# Altium footprint library ICs And Semiconductors THD.PcbLib: 507 footprints (part 24 of 32)
Each footprint in its own frame and in the unit in brackets; x right, y up, seen from the top. Pads: shape width x height; smd on the part's side, far side on the other; paste and mask are expansions set on the pad; w line width, h text height; cw(c..) or ccw(c..) is an arc to the next point about the centre after c.
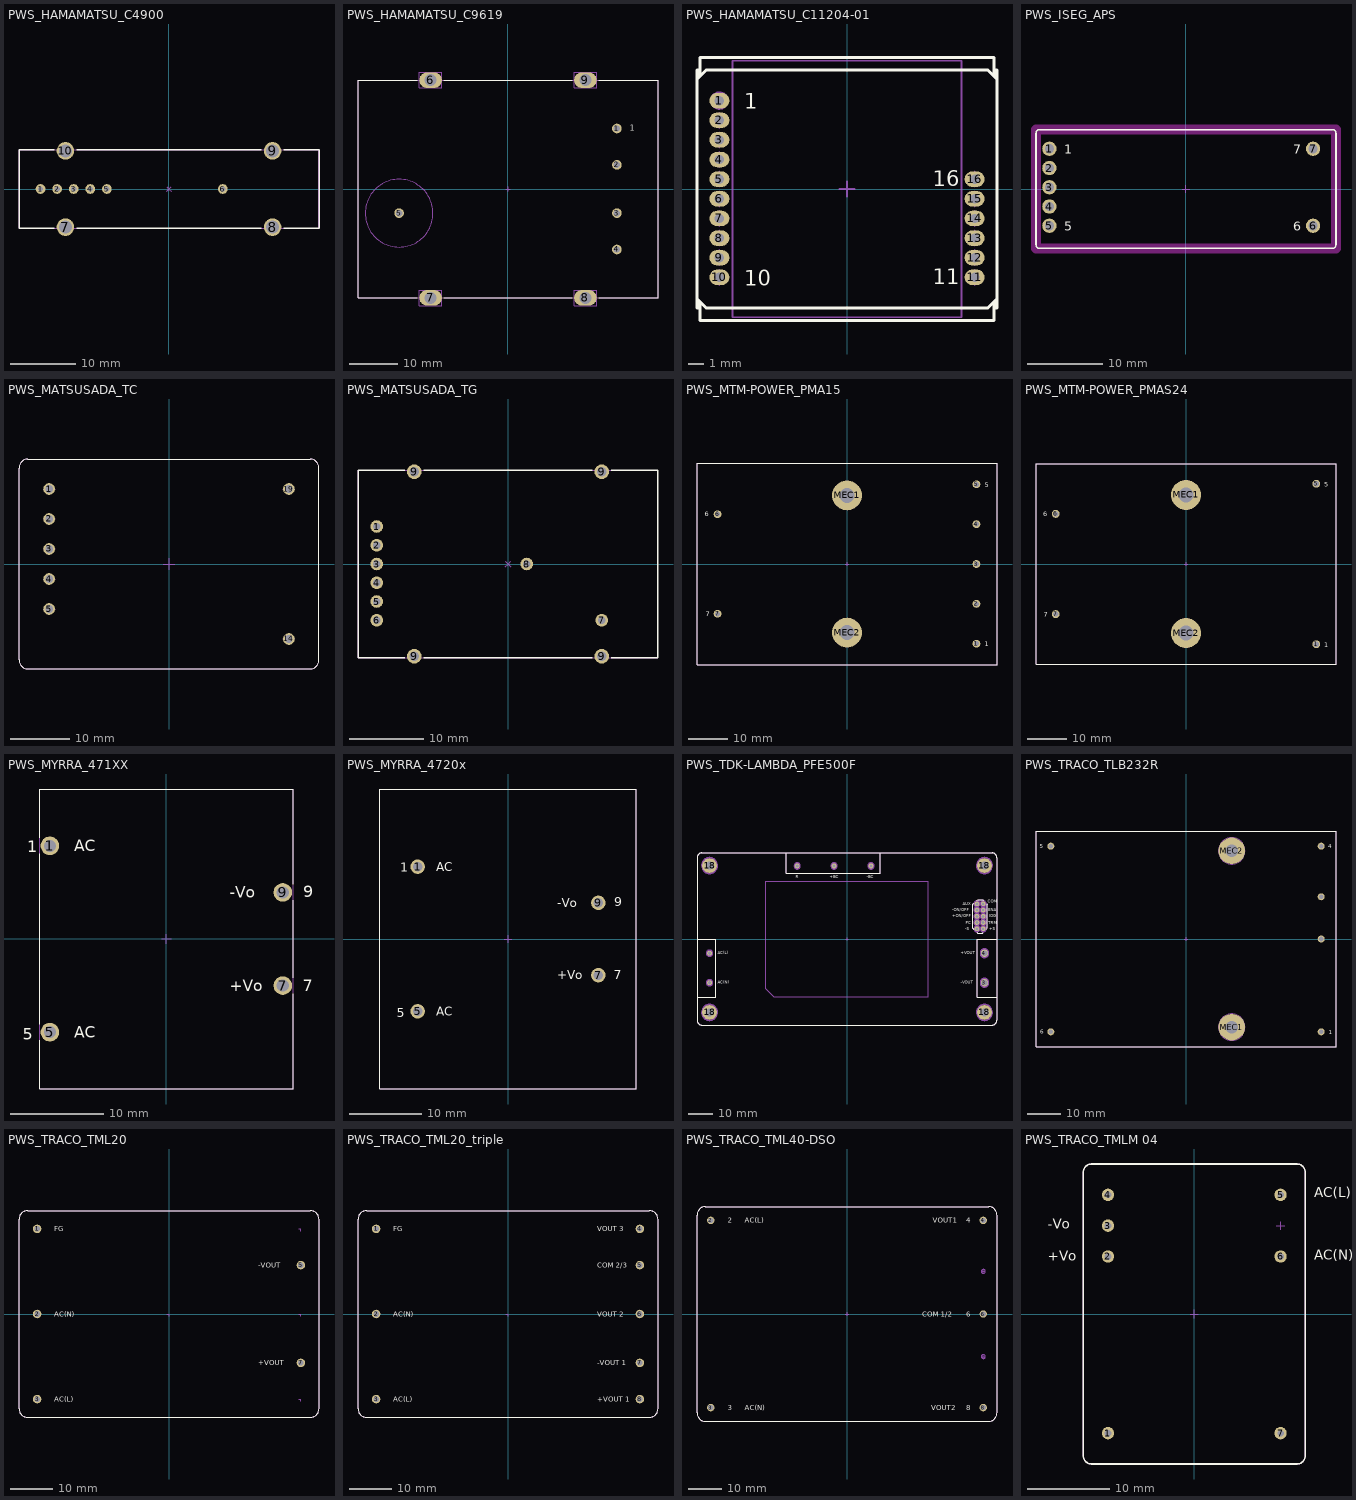
[diagram p23: the footprints below, top view; thin cyan lines are the x and y axes]

## PWS_HAMAMATSU_C4900 [mm] "HAMAMATSU C4900 Series, High Voltage Power Supply , Body 46x12mm"
height 24.5
pads (10):
  round 1.5 hole 0.8: 1(-19.69,0) 2(-17.15,0) 3(-14.61,0) 4(-12.07,0) 5(-9.53,0) 6(8.25,0)
  round 2.7 hole 2: 7(-15.88,-5.85) 8(15.88,-5.85) 9(15.88,5.85) 10(-15.88,5.85)
Top Overlay:
  lines w0.2: -17.623,-6 -23,-6 -23,6 -17.623,6 ; -14.136,-6 14.137,-6 ; -14.136,6 14.137,6 ; 17.624,-6 23,-6 23,6 17.624,6
Notvisible:
  lines w0.1: -20.19,0 -19.69,0 ; -19.69,-0.5 -19.69,0 ; -19.69,0.5 -19.69,0 ; -19.19,0 -19.69,0 ; -17.65,0 -17.15,0 ; -17.15,-0.5 -17.15,0 ; -17.15,0.5 -17.15,0 ; -16.65,0 -17.15,0 ; -16.38,-5.85 -15.88,-5.85 ; -16.38,5.85 -15.88,5.85 ; -15.88,-6.35 -15.88,-5.85 ; -15.88,-5.35 -15.88,-5.85 ; -15.88,5.35 -15.88,5.85 ; -15.88,6.35 -15.88,5.85 ; -15.38,-5.85 -15.88,-5.85 ; -15.38,5.85 -15.88,5.85 ; -15.11,0 -14.61,0 ; -14.61,-0.5 -14.61,0 ; -14.61,0.5 -14.61,0 ; -14.11,0 -14.61,0 ; -12.57,0 -12.07,0 ; -12.07,-0.5 -12.07,0 ; -12.07,0.5 -12.07,0 ; -11.57,0 -12.07,0 ; -10.03,0 -9.53,0 ; -9.53,-0.5 -9.53,0 ; -9.53,0.5 -9.53,0 ; -9.03,0 -9.53,0 ; -0.354,-0.354 0,0 ; -0.354,0.354 0,0 ; 0.354,-0.354 0,0 ; 0.354,0.354 0,0 ; 7.75,0 8.25,0 ; 8.25,-0.5 8.25,0 ; 8.25,0.5 8.25,0 ; 8.75,0 8.25,0 ; 15.38,-5.85 15.88,-5.85 ; 15.38,5.85 15.88,5.85 ; 15.88,-6.35 15.88,-5.85 ; 15.88,-5.35 15.88,-5.85 ; 15.88,5.35 15.88,5.85 ; 15.88,6.35 15.88,5.85 ; 16.38,-5.85 15.88,-5.85 ; 16.38,5.85 15.88,5.85
Mechanical 14:
  lines w0.1: -23,-6 23,-6 23,6 -23,6 -23,-6
3D body "PWS_HAMAMATSU_C4900.stp": height 24.5, standoff -3.6, extent -23,-6 23,6

## PWS_HAMAMATSU_C9619 [mm] "HAMAMATSU C9619 Series, High Voltage Power Supply , Body 62x45mm"
height 16
pads (9):
  round 2 hole 1.3: 1(22.5,12.5) 2(22.5,5) 3(22.5,-5) 4(22.5,-12.5) 5(-22.5,-5)
  rrect100% 4.7x3.2 hole 2.5: 6(-16,22.5) 7(-16,-22.5) 8(16,-22.5) 9(16,22.5)
Top Overlay:
  lines w0.2: -18.75,-22.5 -31,-22.5 -31,22.5 -18.75,22.5 ; -13.25,-22.5 13.25,-22.5 ; -13.25,22.5 13.25,22.5 ; 18.75,-22.5 31,-22.5 31,22.5 18.75,22.5
  text "1" at 25.2,12.05 h1.2
Notvisible:
  circle w0.254: c-22.5,-5 r7
  circle w0.1: c-16,22.5 r1.25
  circle w0.1: c-16,-22.5 r1.25
  circle w0.1: c16,-22.5 r1.25
  circle w0.1: c16,22.5 r1.25
  lines w0.1: -23,-5 -22.5,-5 ; -22.5,-5.5 -22.5,-5 ; -22.5,-4.5 -22.5,-5 ; -22,-5 -22.5,-5 ; -16.5,-22.5 -16,-22.5 ; -16.5,22.5 -16,22.5 ; -16,-23 -16,-22.5 ; -16,-22 -16,-22.5 ; -16,22 -16,22.5 ; -16,23 -16,22.5 ; -15.5,-22.5 -16,-22.5 ; -15.5,22.5 -16,22.5 ; -0.5,0 0,0 ; 0,-0.5 0,0 ; 0,0.5 0,0 ; 0.5,0 0,0 ; 15.5,-22.5 16,-22.5 ; 15.5,22.5 16,22.5 ; 16,-23 16,-22.5 ; 16,-22 16,-22.5 ; 16,22 16,22.5 ; 16,23 16,22.5 ; 16.5,-22.5 16,-22.5 ; 16.5,22.5 16,22.5 ; 22,-12.5 22.5,-12.5 ; 22,-5 22.5,-5 ; 22,5 22.5,5 ; 22,12.5 22.5,12.5 ; 22.5,-13 22.5,-12.5 ; 22.5,-12 22.5,-12.5 ; 22.5,-5.5 22.5,-5 ; 22.5,-4.5 22.5,-5 ; 22.5,4.5 22.5,5 ; 22.5,5.5 22.5,5 ; 22.5,12 22.5,12.5 ; 22.5,13 22.5,12.5 ; 23,-12.5 22.5,-12.5 ; 23,-5 22.5,-5 ; 23,5 22.5,5 ; 23,12.5 22.5,12.5 ; -18.35,-24.1 -13.65,-24.1 -13.65,-20.9 -18.35,-20.9 -18.35,-24.1 ; -18.35,20.9 -13.65,20.9 -13.65,24.1 -18.35,24.1 -18.35,20.9 ; 13.65,-24.1 18.35,-24.1 18.35,-20.9 13.65,-20.9 13.65,-24.1 ; 13.65,20.9 18.35,20.9 18.35,24.1 13.65,24.1 13.65,20.9
Mechanical 14:
  lines w0.1: -31,-22.5 31,-22.5 31,22.5 -31,22.5 -31,-22.5
  text "1" at 25.2,12.05 h1.2
3D body "PWS_HAMAMATSU_C9619.stp": height 16, standoff -3, extent -31,-22.5 31,22.5

## PWS_HAMAMATSU_C11204-01 [mm] "50V to 90V Bias Power Supply with Built-in High Precision Temperature Compensation for MPPCs, Body 19.4x17mm"
height 6.3
pads (16):
  oval 1.3x1 hole 0.6: 1(-8.255,5.715) 2(-8.255,4.445) 3(-8.255,3.175) 4(-8.255,1.905) 5(-8.255,0.635) 6(-8.255,-0.635) 7(-8.255,-1.905) 8(-8.255,-3.175) 9(-8.255,-4.445) 10(-8.255,-5.715) 11(8.255,-5.715) 12(8.255,-4.445) 13(8.255,-3.175) 14(8.255,-1.905) 15(8.255,-0.635) 16(8.255,0.635)
Top Overlay:
  lines w0.2: -9.7,-7.1 -9.1,-7.7 9.1,-7.7 9.7,-7.1 ; -9.7,7.1 -9.1,7.7 9.1,7.7 9.7,7.1 ; -9.5,-7.3 -9.5,-8.5 9.5,-8.5 9.5,-7.3 ; -9.5,7.3 -9.5,8.5 9.5,8.5 9.5,7.3 ; -9.5,7.7 -9.7,7.7 -9.7,-7.7 ; 9.5,-7.7 9.7,-7.7 9.7,7.7 9.5,7.7 ; -9.7,-7.7 -9.5,-7.7 -9.7,-7.7
  text "1" at -6.65,5.175 h1
  text "10" at -6.65,-6.255 h1
  text "11" at 5.53,-6.165 h1
  text "16" at 5.53,0.185 h1
Notvisible:
  circle w0.1: c-8.255,5.715 r0.55
  circle w0.1: c-8.255,5.715 r0.3
  lines w0.1: -8.755,-5.715 -8.255,-5.715 ; -8.755,-4.445 -8.255,-4.445 ; -8.755,-3.175 -8.255,-3.175 ; -8.755,-1.905 -8.255,-1.905 ; -8.755,-0.635 -8.255,-0.635 ; -8.755,0.635 -8.255,0.635 ; -8.755,1.905 -8.255,1.905 ; -8.755,3.175 -8.255,3.175 ; -8.755,4.445 -8.255,4.445 ; -8.755,5.715 -8.255,5.715 ; -8.255,-6.215 -8.255,-5.715 ; -8.255,-5.215 -8.255,-5.715 ; -8.255,-4.945 -8.255,-4.445 ; -8.255,-3.945 -8.255,-4.445 ; -8.255,-3.675 -8.255,-3.175 ; -8.255,-2.675 -8.255,-3.175 ; -8.255,-2.405 -8.255,-1.905 ; -8.255,-1.405 -8.255,-1.905 ; -8.255,-1.135 -8.255,-0.635 ; -8.255,-0.135 -8.255,-0.635 ; -8.255,0.135 -8.255,0.635 ; -8.255,1.135 -8.255,0.635 ; -8.255,1.405 -8.255,1.905 ; -8.255,2.405 -8.255,1.905 ; -8.255,2.675 -8.255,3.175 ; -8.255,3.675 -8.255,3.175 ; -8.255,3.945 -8.255,4.445 ; -8.255,4.945 -8.255,4.445 ; -8.255,5.215 -8.255,5.715 ; -8.255,6.215 -8.255,5.715 ; -7.755,-5.715 -8.255,-5.715 ; -7.755,-4.445 -8.255,-4.445 ; -7.755,-3.175 -8.255,-3.175 ; -7.755,-1.905 -8.255,-1.905 ; -7.755,-0.635 -8.255,-0.635 ; -7.755,0.635 -8.255,0.635 ; -7.755,1.905 -8.255,1.905 ; -7.755,3.175 -8.255,3.175 ; -7.755,4.445 -8.255,4.445 ; -7.755,5.715 -8.255,5.715 ; -0.5,0 0,0 ; 0,-0.5 0,0 ; 0,0.5 0,0 ; 0.5,0 0,0 ; 7.755,-5.715 8.255,-5.715 ; 7.755,-4.445 8.255,-4.445 ; 7.755,-3.175 8.255,-3.175 ; 7.755,-1.905 8.255,-1.905 ; 7.755,-0.635 8.255,-0.635 ; 7.755,0.635 8.255,0.635 ; 8.255,-6.215 8.255,-5.715 ; 8.255,-5.215 8.255,-5.715 ; 8.255,-4.945 8.255,-4.445 ; 8.255,-3.945 8.255,-4.445 ; 8.255,-3.675 8.255,-3.175 ; 8.255,-2.675 8.255,-3.175 ; 8.255,-2.405 8.255,-1.905 ; 8.255,-1.405 8.255,-1.905 ; 8.255,-1.135 8.255,-0.635 ; 8.255,-0.135 8.255,-0.635 ; 8.255,0.135 8.255,0.635 ; 8.255,1.135 8.255,0.635 ; 8.755,-5.715 8.255,-5.715 ; 8.755,-4.445 8.255,-4.445 ; 8.755,-3.175 8.255,-3.175 ; 8.755,-1.905 8.255,-1.905 ; 8.755,-0.635 8.255,-0.635 ; 8.755,0.635 8.255,0.635 ; -7.405,-8.3 7.405,-8.3 7.405,8.3 -7.405,8.3 -7.405,-8.3
Mechanical 14:
  lines w0.1: -9.7,-7.1 -9.1,-7.7 9.1,-7.7 9.7,-7.1 ; -9.7,7.1 -9.1,7.7 9.1,7.7 9.7,7.1 ; -9.5,-7.3 -9.5,-8.5 9.5,-8.5 9.5,-7.3 ; -9.5,7.3 -9.5,8.5 9.5,8.5 9.5,7.3 ; -9.5,7.7 -9.7,7.7 -9.7,-7.7 ; 9.5,-7.7 9.7,-7.7 9.7,7.7 9.5,7.7 ; -9.7,-7.7 -9.5,-7.7 -9.7,-7.7
  text "1" at -6.65,5.175 h1
  text "10" at -6.65,-6.255 h1
  text "11" at 5.53,-6.165 h1
  text "16" at 5.53,0.185 h1
3D body "PWS_HAMAMATSU_C11204-01.stp": height 5.3, standoff -2.6, extent -9.7,-8.5 9.7,8.5

## PWS_ISEG_APS [mm] "Body 39.6x15.7mm, 1W High Voltage Power Supply APS-series"
height 11
pads (7):
  round 1.9 hole 1.2: 1(-18.03,5.31) 2(-18.03,2.77) 3(-18.03,0.23) 4(-18.03,-2.31) 5(-18.03,-4.85) 6(16.77,-4.85) 7(16.77,5.31)
Top Layer keep-out:
  lines w1.27: -19.8,-7.85 -19.8,7.85 19.8,7.85 19.8,-7.85 -19.8,-7.85
Top Overlay:
  lines w0.2: -19.8,-7.35 ccw(c-19.3,-7.35) -19.3,-7.85 19.3,-7.85 ccw(c19.3,-7.35) 19.8,-7.35 19.8,7.35 ccw(c19.3,7.35) 19.3,7.85 -19.3,7.85 ccw(c-19.3,7.35) -19.8,7.35 -19.8,-7.35
  text "6" at 14.16,-5.49 h1.2
  text "7" at 14.16,4.67 h1.2
  text "1" at -16.07,4.655 h1.2
  text "5" at -16.07,-5.505 h1.2
Notvisible:
  lines w0.1: -18.53,-4.85 -18.03,-4.85 ; -18.53,-2.31 -18.03,-2.31 ; -18.53,0.23 -18.03,0.23 ; -18.53,2.77 -18.03,2.77 ; -18.53,5.31 -18.03,5.31 ; -18.03,-5.35 -18.03,-4.85 ; -18.03,-4.35 -18.03,-4.85 ; -18.03,-2.81 -18.03,-2.31 ; -18.03,-1.81 -18.03,-2.31 ; -18.03,-0.27 -18.03,0.23 ; -18.03,0.73 -18.03,0.23 ; -18.03,2.27 -18.03,2.77 ; -18.03,3.27 -18.03,2.77 ; -18.03,4.81 -18.03,5.31 ; -18.03,5.81 -18.03,5.31 ; -17.53,-4.85 -18.03,-4.85 ; -17.53,-2.31 -18.03,-2.31 ; -17.53,0.23 -18.03,0.23 ; -17.53,2.77 -18.03,2.77 ; -17.53,5.31 -18.03,5.31 ; -0.5,0 0,0 ; 0,-0.5 0,0 ; 0,0.5 0,0 ; 0.5,0 0,0 ; 16.27,-4.85 16.77,-4.85 ; 16.27,5.31 16.77,5.31 ; 16.77,-5.35 16.77,-4.85 ; 16.77,-4.35 16.77,-4.85 ; 16.77,4.81 16.77,5.31 ; 16.77,5.81 16.77,5.31 ; 17.27,-4.85 16.77,-4.85 ; 17.27,5.31 16.77,5.31
Mechanical 14:
  lines w0.1: -19.8,-7.35 ccw(c-19.3,-7.35) -19.3,-7.85 19.3,-7.85 ccw(c19.3,-7.35) 19.8,-7.35 19.8,7.35 ccw(c19.3,7.35) 19.3,7.85 -19.3,7.85 ccw(c-19.3,7.35) -19.8,7.35 -19.8,-7.35
  text "6" at 14.16,-5.49 h1.2
  text "7" at 14.16,4.67 h1.2
  text "1" at -16.07,4.655 h1.2
  text "5" at -16.07,-5.505 h1.2
3D body "PWS_ISEG_APS.stp": height 11, standoff -2.2, extent -19.8,-7.85 19.8,7.85

## PWS_MATSUSADA_TC [mm] "TC Serie, Body 50.8x35.5mm, High Voltage Power Supply"
height 16.2
pads (7):
  round 2 hole 1.3: 1(-20.3,12.7) 2(-20.3,7.62) 3(-20.3,2.54) 4(-20.3,-2.54) 5(-20.3,-7.62) 14(20.3,-12.7) 19(20.3,12.7)
Top Overlay:
  lines w0.2: -25.4,-16.25 ccw(c-23.9,-16.25) -23.9,-17.75 23.9,-17.75 ccw(c23.9,-16.25) 25.4,-16.25 25.4,16.25 ccw(c23.9,16.25) 23.9,17.75 -23.9,17.75 ccw(c-23.9,16.25) -25.4,16.25 -25.4,-16.25
Notvisible:
  lines w0.1: -21.3,-7.62 -20.3,-7.62 ; -21.3,-2.54 -20.3,-2.54 ; -21.3,2.54 -20.3,2.54 ; -21.3,7.62 -20.3,7.62 ; -21.3,12.7 -20.3,12.7 ; -20.3,-8.62 -20.3,-7.62 ; -20.3,-6.62 -20.3,-7.62 ; -20.3,-3.54 -20.3,-2.54 ; -20.3,-1.54 -20.3,-2.54 ; -20.3,1.54 -20.3,2.54 ; -20.3,3.54 -20.3,2.54 ; -20.3,6.62 -20.3,7.62 ; -20.3,8.62 -20.3,7.62 ; -20.3,11.7 -20.3,12.7 ; -20.3,13.7 -20.3,12.7 ; -19.3,-7.62 -20.3,-7.62 ; -19.3,-2.54 -20.3,-2.54 ; -19.3,2.54 -20.3,2.54 ; -19.3,7.62 -20.3,7.62 ; -19.3,12.7 -20.3,12.7 ; -1,0 0,0 ; 0,-1 0,0 ; 0,1 0,0 ; 1,0 0,0 ; 19.3,-12.7 20.3,-12.7 ; 19.3,12.7 20.3,12.7 ; 20.3,-13.7 20.3,-12.7 ; 20.3,-11.7 20.3,-12.7 ; 20.3,11.7 20.3,12.7 ; 20.3,13.7 20.3,12.7 ; 21.3,-12.7 20.3,-12.7 ; 21.3,12.7 20.3,12.7
Mechanical 14:
  lines w0.1: -25.4,-16.25 ccw(c-23.9,-16.25) -23.9,-17.75 23.9,-17.75 ccw(c23.9,-16.25) 25.4,-16.25 25.4,16.25 ccw(c23.9,16.25) 23.9,17.75 -23.9,17.75 ccw(c-23.9,16.25) -25.4,16.25 -25.4,-16.25
3D body "PWS_MATSUSADA_TC.stp": height 16.2, standoff -3.6, extent -25.4,-17.75 25.4,17.75

## PWS_MATSUSADA_TG [mm] "TG Serie, Body 40.64x25.4mm, PMT High Voltage Power Supply"
height 12.3
pads (12):
  round 1.7 hole 1: 1(-17.78,5.08) 2(-17.78,2.54) 3(-17.78,0) 4(-17.78,-2.54) 5(-17.78,-5.08) 6(-17.78,-7.62) 7(12.7,-7.62) 8(2.54,0)
  round 2 hole 1.3: 9(-12.7,-12.5) 9(-12.7,12.5) 9(12.7,-12.5) 9(12.7,12.5)
Top Overlay:
  lines w0.2: -13.985,-12.7 -20.32,-12.7 -20.32,12.7 -13.985,12.7 ; -11.415,-12.7 11.415,-12.7 ; -11.415,12.7 11.415,12.7 ; 13.985,-12.7 20.32,-12.7 20.32,12.7 13.985,12.7
Notvisible:
  lines w0.1: -18.28,-7.62 -17.78,-7.62 ; -18.28,-5.08 -17.78,-5.08 ; -18.28,-2.54 -17.78,-2.54 ; -18.28,0 -17.78,0 ; -18.28,2.54 -17.78,2.54 ; -18.28,5.08 -17.78,5.08 ; -17.78,-8.12 -17.78,-7.62 ; -17.78,-7.12 -17.78,-7.62 ; -17.78,-5.58 -17.78,-5.08 ; -17.78,-4.58 -17.78,-5.08 ; -17.78,-3.04 -17.78,-2.54 ; -17.78,-2.04 -17.78,-2.54 ; -17.78,-0.5 -17.78,0 ; -17.78,0.5 -17.78,0 ; -17.78,2.04 -17.78,2.54 ; -17.78,3.04 -17.78,2.54 ; -17.78,4.58 -17.78,5.08 ; -17.78,5.58 -17.78,5.08 ; -17.28,-7.62 -17.78,-7.62 ; -17.28,-5.08 -17.78,-5.08 ; -17.28,-2.54 -17.78,-2.54 ; -17.28,0 -17.78,0 ; -17.28,2.54 -17.78,2.54 ; -17.28,5.08 -17.78,5.08 ; -13.2,-12.5 -12.7,-12.5 ; -13.2,12.5 -12.7,12.5 ; -12.7,-13 -12.7,-12.5 ; -12.7,-12 -12.7,-12.5 ; -12.7,12 -12.7,12.5 ; -12.7,13 -12.7,12.5 ; -12.2,-12.5 -12.7,-12.5 ; -12.2,12.5 -12.7,12.5 ; -0.354,-0.354 0,0 ; -0.354,0.354 0,0 ; 0.354,-0.354 0,0 ; 0.354,0.354 0,0 ; 2.04,0 2.54,0 ; 2.54,-0.5 2.54,0 ; 2.54,0.5 2.54,0 ; 3.04,0 2.54,0 ; 12.2,-12.5 12.7,-12.5 ; 12.2,-7.62 12.7,-7.62 ; 12.2,12.5 12.7,12.5 ; 12.7,-13 12.7,-12.5 ; 12.7,-12 12.7,-12.5 ; 12.7,-8.12 12.7,-7.62 ; 12.7,-7.12 12.7,-7.62 ; 12.7,12 12.7,12.5 ; 12.7,13 12.7,12.5 ; 13.2,-12.5 12.7,-12.5 ; 13.2,-7.62 12.7,-7.62 ; 13.2,12.5 12.7,12.5
Mechanical 14:
  lines w0.1: -20.32,-12.7 20.32,-12.7 20.32,12.7 -20.32,12.7 -20.32,-12.7
3D body "PWS_MATSUSADA_TG.stp": height 12.3, standoff -3, extent -20.32,-12.7 20.32,12.7

## PWS_MTM-POWER_PMA15 [mm] "15W AC/DC Power Module, Body 76x50.8mm, PMA 15 Series"
height 23
pads (9):
  round 2 hole 1.3: 1(33,-20.32) 2(33,-10.16) 3(33,0) 4(33,10.16) 5(33,20.32) 6(-33,12.7) 7(-33,-12.7)
  round 7.6 hole 3.8: MEC1(0,17.5) MEC2(0,-17.5)
Top Overlay:
  lines w0.2: -38.25,-25.65 -38.25,25.65 38.25,25.65 38.25,-25.65 -38.25,-25.65
  text "1" at 35.08,-21.03 h1.2
  text "5" at 35.08,19.61 h1.2
  text "6" at -36.22,12.16 h1.2
  text "7" at -36.02,-13.305 h1.2
Notvisible:
  circle w0.1: c0,-17.5 r3.5
  circle w0.1: c0,17.5 r3.5
  lines w0.1: -33.5,-12.7 -33,-12.7 ; -33.5,12.7 -33,12.7 ; -33,-13.2 -33,-12.7 ; -33,-12.2 -33,-12.7 ; -33,12.2 -33,12.7 ; -33,13.2 -33,12.7 ; -32.5,-12.7 -33,-12.7 ; -32.5,12.7 -33,12.7 ; -0.5,-17.5 0,-17.5 ; -0.5,0 0,0 ; -0.5,17.5 0,17.5 ; 0,-18 0,-17.5 ; 0,-17 0,-17.5 ; 0,-0.5 0,0 ; 0,0.5 0,0 ; 0,17 0,17.5 ; 0,18 0,17.5 ; 0.5,-17.5 0,-17.5 ; 0.5,0 0,0 ; 0.5,17.5 0,17.5 ; 32.5,-20.32 33,-20.32 ; 32.5,-10.16 33,-10.16 ; 32.5,0 33,0 ; 32.5,10.16 33,10.16 ; 32.5,20.32 33,20.32 ; 33,-20.82 33,-20.32 ; 33,-19.82 33,-20.32 ; 33,-10.66 33,-10.16 ; 33,-9.66 33,-10.16 ; 33,-0.5 33,0 ; 33,0.5 33,0 ; 33,9.66 33,10.16 ; 33,10.66 33,10.16 ; 33,19.82 33,20.32 ; 33,20.82 33,20.32 ; 33.5,-20.32 33,-20.32 ; 33.5,-10.16 33,-10.16 ; 33.5,0 33,0 ; 33.5,10.16 33,10.16 ; 33.5,20.32 33,20.32
Mechanical 14:
  lines w0.1: -38.25,-25.65 -38.25,25.65 38.25,25.65 38.25,-25.65 -38.25,-25.65
  text "1" at 35.08,-21.03 h1.2
  text "5" at 35.08,19.61 h1.2
  text "6" at -36.22,12.16 h1.2
  text "7" at -36.02,-13.305 h1.2
3D body "MTM-POWER_PMA15.stp": height 23, standoff -3.6, extent -38.25,-25.65 38.25,25.65

## PWS_MTM-POWER_PMAS24 [mm] "24W AC/DC Power Module, Body 76x50.7mm, PMAS24 Series"
height 22.7
pads (6):
  round 2 hole 1.3: 1(33,-20.32) 5(33,20.32) 6(-33,12.7) 7(-33,-12.7)
  round 7.6 hole 3.8: MEC1(0,17.5) MEC2(0,-17.5)
Top Overlay:
  lines w0.2: -38,-25.35 38,-25.35 38,25.35 -38,25.35 -38,-25.35
  text "1" at 35.08,-21.03 h1.2
  text "5" at 35.08,19.61 h1.2
  text "6" at -36.22,12.16 h1.2
  text "7" at -36.02,-13.305 h1.2
Notvisible:
  circle w0.1: c0,-17.5 r3.5
  circle w0.1: c0,17.5 r3.5
  lines w0.1: -33.5,-12.7 -33,-12.7 ; -33.5,12.7 -33,12.7 ; -33,-13.2 -33,-12.7 ; -33,-12.2 -33,-12.7 ; -33,12.2 -33,12.7 ; -33,13.2 -33,12.7 ; -32.5,-12.7 -33,-12.7 ; -32.5,12.7 -33,12.7 ; -0.5,-17.5 0,-17.5 ; -0.5,0 0,0 ; -0.5,17.5 0,17.5 ; 0,-18 0,-17.5 ; 0,-17 0,-17.5 ; 0,-0.5 0,0 ; 0,0.5 0,0 ; 0,17 0,17.5 ; 0,18 0,17.5 ; 0.5,-17.5 0,-17.5 ; 0.5,0 0,0 ; 0.5,17.5 0,17.5 ; 32.5,-20.32 33,-20.32 ; 32.5,20.32 33,20.32 ; 33,-20.82 33,-20.32 ; 33,-19.82 33,-20.32 ; 33,19.82 33,20.32 ; 33,20.82 33,20.32 ; 33.5,-20.32 33,-20.32 ; 33.5,20.32 33,20.32
Mechanical 14:
  lines w0.1: -38,-25.35 38,-25.35 38,25.35 -38,25.35 -38,-25.35
  text "1" at 35.08,-21.03 h1.2
  text "5" at 35.08,19.61 h1.2
  text "6" at -36.22,12.16 h1.2
  text "7" at -36.02,-13.305 h1.2
3D body "MTM-POWER_PMAS.stp": height 22.7, standoff -3.6, extent -38,-25.35 38,25.35

## PWS_MYRRA_471XX [mm] "MYRRA 2.5W Single Output Series, Body 32.2x27.2mm, Power Supply"
height 22.3
pads (4):
  round 2 hole 1.3: 1(-12.5,10) 5(-12.5,-10) 7(12.5,-5) 9(12.5,5)
Top Overlay:
  lines w0.1: -13.6,-10.85 -13.6,-16.1 13.6,-16.1 13.6,-5.85 ; -13.6,-9.15 -13.6,9.15 ; -13.6,10.85 -13.6,16.1 13.6,16.1 13.6,5.85 ; 13.6,-4.15 13.6,4.15
  text "-Vo" at 6.8,4.41 h1.2
  text "7" at 14.62,-5.59 h1.27
  text "9" at 14.7,4.5 h1.27
  text "AC" at -9.9,9.4 h1.2
  text "AC" at -9.9,-10.6 h1.2
  text "1" at -14.92,9.29 h1.27
  text "5" at -15.4,-10.8 h1.27
  text "+Vo" at 6.8,-5.59 h1.2
Notvisible:
  lines w0.1: -13,-10 -12.5,-10 ; -13,10 -12.5,10 ; -12.5,-10.5 -12.5,-10 ; -12.5,-9.5 -12.5,-10 ; -12.5,9.5 -12.5,10 ; -12.5,10.5 -12.5,10 ; -12,-10 -12.5,-10 ; -12,10 -12.5,10 ; -0.5,0 0,0 ; 0,-0.5 0,0 ; 0,0.5 0,0 ; 0.5,0 0,0 ; 12,-5 12.5,-5 ; 12,5 12.5,5 ; 12.5,-5.5 12.5,-5 ; 12.5,-4.5 12.5,-5 ; 12.5,4.5 12.5,5 ; 12.5,5.5 12.5,5 ; 13,-5 12.5,-5 ; 13,5 12.5,5
Mechanical 14:
  lines w0.1: -13.6,-16.1 13.6,-16.1 13.6,16.1 -13.6,16.1 -13.6,-16.1
  text "-Vo" at 6.8,4.41 h1.2
  text "7" at 14.62,-5.59 h1.27
  text "9" at 14.7,4.5 h1.27
  text "1" at -14.92,9.29 h1.27
  text "5" at -15.4,-10.8 h1.27
  text "+Vo" at 6.8,-5.59 h1.2
3D body "PWS_MYRRA_471xx.stp": height 22.3, standoff -3.6, extent -13.6,-16.1 13.6,16.1

## PWS_MYRRA_4720x [mm] "MYRRA 7.5W Single Output Series, Body 41.5x35.5mm, Power Supply"
height 25
pads (4):
  round 2 hole 1.3: 1(-12.5,10) 5(-12.5,-10) 7(12.5,-5) 9(12.5,5)
Top Overlay:
  lines w0.1: -17.75,-20.75 -17.75,20.75 17.75,20.75 17.75,-20.75 -17.75,-20.75
  text "-Vo" at 6.8,4.41 h1.2
  text "7" at 14.62,-5.59 h1.27
  text "9" at 14.7,4.5 h1.27
  text "AC" at -9.9,9.4 h1.2
  text "AC" at -9.9,-10.6 h1.2
  text "1" at -14.92,9.29 h1.27
  text "5" at -15.4,-10.8 h1.27
  text "+Vo" at 6.8,-5.59 h1.2
Notvisible:
  lines w0.1: -13,-10 -12.5,-10 ; -13,10 -12.5,10 ; -12.5,-10.5 -12.5,-10 ; -12.5,-9.5 -12.5,-10 ; -12.5,9.5 -12.5,10 ; -12.5,10.5 -12.5,10 ; -12,-10 -12.5,-10 ; -12,10 -12.5,10 ; -0.5,0 0,0 ; 0,-0.5 0,0 ; 0,0.5 0,0 ; 0.5,0 0,0 ; 12,-5 12.5,-5 ; 12,5 12.5,5 ; 12.5,-5.5 12.5,-5 ; 12.5,-4.5 12.5,-5 ; 12.5,4.5 12.5,5 ; 12.5,5.5 12.5,5 ; 13,-5 12.5,-5 ; 13,5 12.5,5
Mechanical 14:
  lines w0.1: -17.75,-20.75 -17.75,20.75 17.75,20.75 17.75,-20.75 -17.75,-20.75
  text "-Vo" at 6.8,4.41 h1.2
  text "7" at 14.62,-5.59 h1.27
  text "9" at 14.7,4.5 h1.27
  text "1" at -14.92,9.29 h1.27
  text "5" at -15.4,-10.8 h1.27
  text "+Vo" at 6.8,-5.59 h1.2
3D body "PWS_MYRRA_4720x.stp": height 25, standoff -3.6, extent -17.75,-20.75 17.75,20.75

## PWS_TDK-LAMBDA_PFE500F [mm] "PFE-F Serie, 500W; Body 122x70mm, PMT High Voltage Power Supply"
height 13.4
pads (21):
  round 2 hole 1.3: 1(-55.9,-5.78) 2(-55.9,-17.78) 15(9.74,29.73) 16(-5.26,29.73) 17(-20.26,29.73)
  round 3 hole 2.3: 3(55.9,-17.78) 4(55.9,-5.78)
  round 1.9 hole 1.2: 5(52.85,4.15) 6(55.39,4.15) 7(52.85,6.69) 8(55.39,6.69) 9(52.85,9.23) 10(55.39,9.23) 11(52.85,11.77) 12(55.39,11.77) 13(52.85,14.31) 14(55.39,14.31)
  round 6 hole 3.2: 18(-55.9,-29.85) 18(-55.9,29.85) 18(55.9,-29.85) 18(55.9,29.85)
Top Overlay:
  lines w0.2: -61,-23.6 -53.4,-23.6 -53.4,0 -61,0 ; -24.76,35 -24.76,26.83 13.54,26.83 13.54,35 ; 51.5,4.02 51.12,4.4 51.12,14.06 51.5,14.44 ; 52.75,2.77 53.12,2.4 55.12,2.4 55.5,2.78 ; 52.75,15.69 53.12,16.06 55.12,16.06 55.5,15.68 ; 56.75,4.03 57.12,4.4 57.12,14.06 56.75,14.43 ; 61,-23.6 53,-23.6 53,0 61,0 ; -60.999,-33 ccw(c-59.001,-33.001) -59,-35 59,-35 ccw(c59,-33) 61,-33 60.999,33 ccw(c59.001,33.001) 59,35 -59,35 ccw(c-59,33) -61,33 -60.999,-33
  text "-S" at 48,3.5 h1.2
  text "R" at -20.75,24.75 h1.2
  text "+BC" at -7,24.75 h1.2
  text "-BC" at 8,24.75 h1.2
  text "+VOUT" at 46.25,-6.25 h1.2
  text "-VOUT" at 46.25,-18.25 h1.2
  text "AC(L)" at -52.5,-6.25 h1.2
  text "AC(N)" at -52.5,-18.25 h1.2
  text "PC" at 48.25,6 h1.2
  text "+ON/OFF" at 42.75,8.75 h1.2
  text "-ON/OFF" at 42.75,11.25 h1.2
  text "AUX" at 47,13.75 h1.2
  text "+S" at 57.75,3.5 h1.2
  text "ENA" at 57.5,11.25 h1.2
  text "IOG" at 57.75,8.75 h1.2
  text "TRM" at 57.5,6 h1.2
  text "COM" at 57.25,14.75 h1.2
Notvisible:
  circle w0.1: c55.39,4.15 r0.6
  circle w0.1: c55.39,4.15 r0.95
  circle w0.1: c55.39,4.15 r1.25
  circle w0.1: c52.85,4.15 r0.6
  circle w0.1: c52.85,4.15 r0.95
  circle w0.1: c52.85,4.15 r1.25
  circle w0.1: c55.39,6.69 r0.6
  circle w0.1: c55.39,6.69 r0.95
  circle w0.1: c55.39,6.69 r1.25
  circle w0.1: c52.85,6.69 r0.6
  circle w0.1: c52.85,6.69 r0.95
  circle w0.1: c52.85,6.69 r1.25
  circle w0.1: c55.39,9.23 r0.6
  circle w0.1: c55.39,9.23 r0.95
  circle w0.1: c55.39,9.23 r1.25
  circle w0.1: c52.85,9.23 r0.6
  circle w0.1: c52.85,9.23 r0.95
  circle w0.1: c52.85,9.23 r1.25
  circle w0.1: c55.39,11.77 r0.6
  circle w0.1: c55.39,11.77 r0.95
  circle w0.1: c55.39,11.77 r1.25
  circle w0.1: c52.85,11.77 r0.6
  circle w0.1: c52.85,11.77 r0.95
  circle w0.1: c52.85,11.77 r1.25
  circle w0.1: c55.39,14.31 r0.6
  circle w0.1: c55.39,14.31 r0.95
  circle w0.1: c55.39,14.31 r1.25
  circle w0.1: c52.85,14.31 r0.6
  circle w0.1: c52.85,14.31 r0.95
  circle w0.1: c52.85,14.31 r1.25
  circle w0.1: c55.9,-5.78 r1.15
  circle w0.1: c55.9,-5.78 r1.5
  circle w0.1: c55.9,-5.78 r1.8
  circle w0.1: c-55.9,-5.78 r0.65
  circle w0.1: c-55.9,-5.78 r1
  circle w0.1: c-55.9,-5.78 r1.3
  circle w0.1: c55.9,-17.78 r1.15
  circle w0.1: c55.9,-17.78 r1.5
  circle w0.1: c55.9,-17.78 r1.8
  circle w0.1: c-55.9,-17.78 r0.65
  circle w0.1: c-55.9,-17.78 r1
  circle w0.1: c-55.9,-17.78 r1.3
  circle w0.1: c-55.9,-29.85 r1.6
  circle w0.1: c-55.9,-29.85 r3
  circle w0.1: c-55.9,-29.85 r3.3
  circle w0.1: c55.9,-29.85 r1.6
  circle w0.1: c55.9,-29.85 r3
  circle w0.1: c55.9,-29.85 r3.3
  circle w0.1: c55.9,29.85 r1.6
  circle w0.1: c55.9,29.85 r3
  circle w0.1: c55.9,29.85 r3.3
  circle w0.1: c-55.9,29.85 r1.6
  circle w0.1: c-55.9,29.85 r3
  circle w0.1: c-55.9,29.85 r3.3
  circle w0.1: c-5.26,29.73 r0.65
  circle w0.1: c-5.26,29.73 r1
  circle w0.1: c-5.26,29.73 r1.3
  circle w0.1: c-20.26,29.73 r0.65
  circle w0.1: c-20.26,29.73 r1
  circle w0.1: c-20.26,29.73 r1.3
  circle w0.1: c9.74,29.73 r0.65
  circle w0.1: c9.74,29.73 r1
  circle w0.1: c9.74,29.73 r1.3
  lines w0.1: -56.4,-29.85 -55.4,-29.85 ; -56.4,-17.78 -55.4,-17.78 ; -56.4,-5.78 -55.4,-5.78 ; -56.4,29.85 -55.4,29.85 ; -55.9,-30.35 -55.9,-29.35 ; -55.9,-18.28 -55.9,-17.28 ; -55.9,-6.28 -55.9,-5.28 ; -55.9,29.35 -55.9,30.35 ; -20.76,29.73 -19.76,29.73 ; -20.26,29.23 -20.26,30.23 ; -5.76,29.73 -4.76,29.73 ; -5.26,29.23 -5.26,30.23 ; -0.5,0 0,0 ; 0,-0.5 0,0 ; 0,0.5 0,0 ; 0.5,0 0,0 ; 9.24,29.73 10.24,29.73 ; 9.74,29.23 9.74,30.23 ; 52.35,4.15 53.35,4.15 ; 52.35,6.69 53.35,6.69 ; 52.35,9.23 53.35,9.23 ; 52.35,11.77 53.35,11.77 ; 52.35,14.31 53.35,14.31 ; 52.85,3.65 52.85,4.65 ; 52.85,6.19 52.85,7.19 ; 52.85,8.73 52.85,9.73 ; 52.85,11.27 52.85,12.27 ; 52.85,13.81 52.85,14.81 ; 54.89,4.15 55.89,4.15 ; 54.89,6.69 55.89,6.69 ; 54.89,9.23 55.89,9.23 ; 54.89,11.77 55.89,11.77 ; 54.89,14.31 55.89,14.31 ; 55.39,3.65 55.39,4.65 ; 55.39,6.19 55.39,7.19 ; 55.39,8.73 55.39,9.73 ; 55.39,11.27 55.39,12.27 ; 55.39,13.81 55.39,14.81 ; 55.4,-29.85 56.4,-29.85 ; 55.4,-17.78 56.4,-17.78 ; 55.4,-5.78 56.4,-5.78 ; 55.4,29.85 56.4,29.85 ; 55.9,-30.35 55.9,-29.35 ; 55.9,-18.28 55.9,-17.28 ; 55.9,-6.28 55.9,-5.28 ; 55.9,29.35 55.9,30.35
Mechanical 14:
  lines w0.1: -61,-23.6 -53.4,-23.6 -53.4,0 -61,0 ; -24.76,35 -24.76,26.83 13.54,26.83 13.54,35 ; 61,-23.6 53,-23.6 53,0 61,0 ; -60.999,-33 ccw(c-59.001,-33.001) -59,-35 59,-35 ccw(c59,-33) 61,-33 60.999,33 ccw(c59.001,33.001) 59,35 -59,35 ccw(c-59,33) -61,33 -60.999,-33 ; -33,-20.2 -33,23.5 33,23.5 33,-23.5 -29.7,-23.5 -33,-20.2 ; 51.12,4.4 53.12,2.4 55.12,2.4 57.12,4.4 57.12,14.06 55.12,16.06 53.12,16.06 51.12,14.06 51.12,4.4
  text "-S" at 48,3.5 h1.2
  text "R" at -20.75,24.75 h1.2
  text "+BC" at -7,24.75 h1.2
  text "-BC" at 8,24.75 h1.2
  text "+VOUT" at 46.25,-6.25 h1.2
  text "-VOUT" at 46.25,-18.25 h1.2
  text "AC(L)" at -52.5,-6.25 h1.2
  text "AC(N)" at -52.5,-18.25 h1.2
  text "PC" at 48.25,6 h1.2
  text "+ON/OFF" at 42.75,8.75 h1.2
  text "-ON/OFF" at 42.75,11.25 h1.2
  text "AUX" at 47,13.75 h1.2
  text "+S" at 57.75,3.5 h1.2
  text "ENA" at 57.5,11.25 h1.2
  text "IOG" at 57.75,8.75 h1.2
  text "TRM" at 57.5,6 h1.2
  text "COM" at 57.25,14.75 h1.2
3D body "PWS_TDK-LAMBDA_PFE500F.stp": height 12.7, standoff -5, extent -61,-35 61,35

## PWS_TRACO_TLB232R [mm] "TLB Model For PCB Mount, Body 89x64mm"
height 40.5
pads (8):
  round 2.1 hole 1.4: 1(40.65,-27.9) 2(40.65,0) 3(40.65,12.7) 4(40.65,27.9) 5(-40.65,27.9) 6(-40.65,-27.9)
  round 8 hole 3.8: MEC1(13.75,-26.5) MEC2(13.75,26.5)
Top Overlay:
  lines w0.2: -45.1,-32.35 45.1,-32.35 45.1,32.35 -45.1,32.35 -45.1,-32.35
  text "1" at 42.93,-28.61 h1.2
  text "4" at 42.83,27.265 h1.2
  text "6" at -43.77,-28.48 h1.2
  text "5" at -43.97,27.31 h1.2
Notvisible:
  circle w0.1: c-40.65,27.9 r0.5
  circle w0.1: c-40.65,-27.9 r0.5
  circle w0.1: c13.75,-26.5 r1.5
  circle w0.1: c40.65,-27.9 r0.5
  circle w0.1: c40.65,0 r0.5
  circle w0.1: c40.65,12.7 r0.5
  circle w0.1: c40.65,27.9 r0.5
  circle w0.1: c13.75,-26.5 r4
  circle w0.1: c13.75,26.5 r1.5
  circle w0.1: c13.75,26.5 r4
  lines w0.1: -41.15,-27.9 -40.65,-27.9 ; -41.15,27.9 -40.65,27.9 ; -40.65,-28.4 -40.65,-27.9 ; -40.65,-27.4 -40.65,-27.9 ; -40.65,27.4 -40.65,27.9 ; -40.65,28.4 -40.65,27.9 ; -40.15,-27.9 -40.65,-27.9 ; -40.15,27.9 -40.65,27.9 ; -0.5,0 0,0 ; 0,-0.5 0,0 ; 0,0.5 0,0 ; 0.5,0 0,0 ; 13.25,-26.5 13.75,-26.5 ; 13.25,26.5 13.75,26.5 ; 13.75,-27 13.75,-26.5 ; 13.75,-26 13.75,-26.5 ; 13.75,26 13.75,26.5 ; 13.75,27 13.75,26.5 ; 14.25,-26.5 13.75,-26.5 ; 14.25,26.5 13.75,26.5 ; 40.15,-27.9 40.65,-27.9 ; 40.15,0 40.65,0 ; 40.15,12.7 40.65,12.7 ; 40.15,27.9 40.65,27.9 ; 40.65,-28.4 40.65,-27.9 ; 40.65,-27.4 40.65,-27.9 ; 40.65,-0.5 40.65,0 ; 40.65,0.5 40.65,0 ; 40.65,12.2 40.65,12.7 ; 40.65,13.2 40.65,12.7 ; 40.65,27.4 40.65,27.9 ; 40.65,28.4 40.65,27.9 ; 41.15,-27.9 40.65,-27.9 ; 41.15,0 40.65,0 ; 41.15,12.7 40.65,12.7 ; 41.15,27.9 40.65,27.9
Mechanical 14:
  lines w0.1: 45.1,-27.85 45.1,-32.35 ; 45.1,-32.35 45.1,32.35 -45.1,32.35 -45.1,-32.35 45.1,-32.35
  text "1" at 42.93,-28.61 h1.2
  text "4" at 42.83,27.265 h1.2
  text "6" at -43.77,-28.48 h1.2
  text "5" at -43.97,27.31 h1.2
3D body "PWS_TRACO_TLB232R.stp": height 40.25, standoff -6.3, extent -45.1,-32.35 45.1,32.35

## PWS_TRACO_TML20 [mm] "TML 20 Single Output Series , Body 70.5x48.5mm, Power Supply"
height 22.5
pads (5):
  round 2 hole 1.3: 1(-31,20) 2(-31,0) 3(-31,-20) 5(31,11.5) 7(31,-11.5)
Top Overlay:
  lines w0.2: -35.25,-22.25 ccw(c-33.25,-22.25) -33.25,-24.25 33.25,-24.25 ccw(c33.25,-22.25) 35.25,-22.25 35.25,22.25 ccw(c33.25,22.25) 33.25,24.25 -33.25,24.25 ccw(c-33.25,22.25) -35.25,22.25 -35.25,-22.25
  text "FG" at -27,19.4 h1.2
  text "AC(N)" at -27,-0.6 h1.2
  text "AC(L)" at -27,-20.6 h1.2
  text "+VOUT" at 21,-12.1 h1.2
  text "-VOUT" at 21,10.9 h1.2
Notvisible:
  lines w0.05: -31.5,-20 -31,-20 -31,-20.5 ; -31.5,0 -31,0 -31,-0.5 ; -31.5,20 -31,20 -31,19.5 ; -0.5,0 0,0 0,-0.5 ; 30.5,-20 31,-20 31,-20.5 ; 30.5,-11.5 31,-11.5 31,-12 ; 30.5,0 31,0 31,-0.5 ; 30.5,11.5 31,11.5 31,11 ; 30.5,20 31,20 31,19.5
  text "4" at 26,19.4 h1.2
  text "6" at 26,-0.6 h1.2
  text "8" at 26,-20.6 h1.2
Mechanical 14:
  lines w0.1: -35.25,-22.25 ccw(c-33.25,-22.25) -33.25,-24.25 33.25,-24.25 ccw(c33.25,-22.25) 35.25,-22.25 35.25,22.25 ccw(c33.25,22.25) 33.25,24.25 -33.25,24.25 ccw(c-33.25,22.25) -35.25,22.25 -35.25,-22.25
  text "-VOUT" at 21,10.9 h1.2
  text "+VOUT" at 21,-12.1 h1.2
  text "AC(L)" at -27,-20.6 h1.2
  text "AC(N)" at -27,-0.6 h1.2
  text "FG" at -27,19.4 h1.2
3D body "PWS_TRACO_TML20.stp": height 22.5, standoff -3.1, extent -35.25,-24.25 35.25,24.25

## PWS_TRACO_TML20_triple [mm] "TML 20 Triple Output Series , Body 70.5x48.5mm, Power Supply"
height 22.5
pads (8):
  round 2 hole 1.3: 1(-31,20) 2(-31,0) 3(-31,-20) 4(31,20) 5(31,11.5) 6(31,0) 7(31,-11.5) 8(31,-20)
Top Overlay:
  lines w0.2: -35.25,-22.25 ccw(c-33.25,-22.25) -33.25,-24.25 33.25,-24.25 ccw(c33.25,-22.25) 35.25,-22.25 35.25,22.25 ccw(c33.25,22.25) 33.25,24.25 -33.25,24.25 ccw(c-33.25,22.25) -35.25,22.25 -35.25,-22.25
  text "COM 2/3" at 21,10.9 h1.2
  text "-VOUT 1" at 21,-12.1 h1.2
  text "AC(L)" at -27,-20.6 h1.2
  text "AC(N)" at -27,-0.6 h1.2
  text "FG" at -27,19.4 h1.2
  text "VOUT 3" at 21,19.4 h1.2
  text "VOUT 2" at 21,-0.6 h1.2
  text "+VOUT 1" at 21,-20.6 h1.2
Notvisible:
  lines w0.05: -31.5,-20 -31,-20 -31,-20.5 ; -31.5,0 -31,0 -31,-0.5 ; -31.5,20 -31,20 -31,19.5 ; -0.5,0 0,0 0,-0.5 ; 30.5,-20 31,-20 31,-20.5 ; 30.5,-11.5 31,-11.5 31,-12 ; 30.5,0 31,0 31,-0.5 ; 30.5,11.5 31,11.5 31,11 ; 30.5,20 31,20 31,19.5
Mechanical 14:
  lines w0.1: -35.25,-22.25 ccw(c-33.25,-22.25) -33.25,-24.25 33.25,-24.25 ccw(c33.25,-22.25) 35.25,-22.25 35.25,22.25 ccw(c33.25,22.25) 33.25,24.25 -33.25,24.25 ccw(c-33.25,22.25) -35.25,22.25 -35.25,-22.25
  text "FG" at -27,19.4 h1.2
  text "AC(N)" at -27,-0.6 h1.2
  text "AC(L)" at -27,-20.6 h1.2
  text "-VOUT 1" at 21,-12.1 h1.2
  text "COM 2/3" at 21,10.9 h1.2
  text "VOUT 3" at 21,19.4 h1.2
  text "VOUT 2" at 21,-0.6 h1.2
  text "+VOUT 1" at 21,-20.6 h1.2
3D body "PWS_TRACO_TML20_Triple.stp": height 22.5, standoff -3.1, extent -35.25,-24.25 35.25,24.25

## PWS_TRACO_TML40-DSO [mm] "TML 40 Series, Dual Sym Outputs, Body 89.5x64mm, Power Supply"
height 25.5
pads (5):
  round 2.2 hole 1.5: 2(-40.65,27.94) 3(-40.65,-27.94) 4(40.65,27.94) 6(40.65,0) 8(40.65,-27.94)
Top Overlay:
  lines w0.2: -44.75,-29.5 ccw(c-42.25,-29.5) -42.25,-32 42.25,-32 ccw(c42.25,-29.5) 44.75,-29.5 44.75,29.5 ccw(c42.25,29.5) 42.25,32 -42.25,32 ccw(c-42.25,29.5) -44.75,29.5 -44.75,-29.5
  text "VOUT1" at 25.57,27.19 h1.5
  text "COM 1/2" at 22.47,-0.75 h1.5
  text "VOUT2" at 25.07,-28.69 h1.5
  text "AC(L)" at -30.57,27.19 h1.5
  text "AC(N)" at -30.57,-28.69 h1.5
  text "2" at -35.57,27.19 h1.5
  text "3" at -35.57,-28.69 h1.5
  text "4" at 35.57,27.19 h1.5
  text "6" at 35.57,-0.75 h1.5
  text "8" at 35.57,-28.69 h1.5
Notvisible:
  circle w0.1: c40.65,12.7 r0.6
  circle w0.1: c40.65,-12.7 r0.6
  lines w0.1: -41.15,-27.94 -40.65,-27.94 ; -41.15,27.94 -40.65,27.94 ; -40.65,-28.44 -40.65,-27.94 ; -40.65,-27.44 -40.65,-27.94 ; -40.65,27.44 -40.65,27.94 ; -40.65,28.44 -40.65,27.94 ; -40.15,-27.94 -40.65,-27.94 ; -40.15,27.94 -40.65,27.94 ; -0.5,0 0,0 ; 0,-0.5 0,0 ; 0,0.5 0,0 ; 0.5,0 0,0 ; 40.15,-27.94 40.65,-27.94 ; 40.15,-12.7 40.65,-12.7 ; 40.15,0 40.65,0 ; 40.15,12.7 40.65,12.7 ; 40.15,27.94 40.65,27.94 ; 40.65,-28.44 40.65,-27.94 ; 40.65,-27.44 40.65,-27.94 ; 40.65,-13.2 40.65,-12.7 ; 40.65,-12.2 40.65,-12.7 ; 40.65,-0.5 40.65,0 ; 40.65,0.5 40.65,0 ; 40.65,12.2 40.65,12.7 ; 40.65,13.2 40.65,12.7 ; 40.65,27.44 40.65,27.94 ; 40.65,28.44 40.65,27.94 ; 41.15,-27.94 40.65,-27.94 ; 41.15,-12.7 40.65,-12.7 ; 41.15,0 40.65,0 ; 41.15,12.7 40.65,12.7 ; 41.15,27.94 40.65,27.94
  text "5" at 35.57,11.95 h1.5
  text "7" at 35.57,-13.45 h1.5
Mechanical 14:
  lines w0.1: -44.75,-29.5 ccw(c-42.25,-29.5) -42.25,-32 42.25,-32 ccw(c42.25,-29.5) 44.75,-29.5 44.75,29.5 ccw(c42.25,29.5) 42.25,32 -42.25,32 ccw(c-42.25,29.5) -44.75,29.5 -44.75,-29.5
  text "VOUT1" at 25.57,27.19 h1.5
  text "COM 1/2" at 22.47,-0.75 h1.5
  text "VOUT2" at 25.07,-28.69 h1.5
  text "AC(L)" at -30.57,27.19 h1.5
  text "AC(N)" at -30.57,-28.69 h1.5
  text "2" at -35.57,27.19 h1.5
  text "3" at -35.57,-28.69 h1.5
  text "4" at 35.57,27.19 h1.5
  text "6" at 35.57,-0.75 h1.5
  text "8" at 35.57,-28.69 h1.5
3D body "PWS_TRACO_TML40.stp": height 25.5, standoff -6, extent -44.75,-32 44.75,32

## PWS_TRACO_TMLM 04 [mm] "TMLM 04 Series , Body 36.5x27mm, Power Supply"
height 17.1
pads (7):
  round 1.5 hole 0.8: 1(-10.5,-14.5) 2(-10.5,7) 3(-10.5,10.75) 4(-10.5,14.5) 5(10.5,14.5) 6(10.5,7) 7(10.5,-14.5)
Top Overlay:
  lines w0.2: -13.5,-17.25 ccw(c-12.5,-17.25) -12.5,-18.25 12.5,-18.25 ccw(c12.5,-17.25) 13.5,-17.25 13.5,17.25 ccw(c12.5,17.25) 12.5,18.25 -12.5,18.25 ccw(c-12.5,17.25) -13.5,17.25 -13.5,-17.25
  text "AC(N)" at 14.585,6.6 h1.2
  text "AC(L)" at 14.585,14.2 h1.2
  text "-Vo" at -17.8,10.4 h1.2
  text "+Vo" at -17.8,6.5 h1.2
Notvisible:
  lines w0.05: -11,-14.5 -10.5,-14.5 ; -11,14.5 -10.5,14.5 ; -10.5,-15 -10.5,-14.5 ; -10.5,-14 -10.5,-14.5 ; -10.5,14 -10.5,14.5 ; -10.5,15 -10.5,14.5 ; -10,-14.5 -10.5,-14.5 ; -10,14.5 -10.5,14.5 ; 10,-14.5 10.5,-14.5 ; 10,7 10.5,7 ; 10,10.75 10.5,10.75 ; 10,14.5 10.5,14.5 ; 10.5,-15 10.5,-14.5 ; 10.5,-14 10.5,-14.5 ; 10.5,6.5 10.5,7 ; 10.5,7.5 10.5,7 ; 10.5,10.25 10.5,10.75 ; 10.5,11.25 10.5,10.75 ; 10.5,14 10.5,14.5 ; 10.5,15 10.5,14.5 ; 11,-14.5 10.5,-14.5 ; 11,7 10.5,7 ; 11,10.75 10.5,10.75 ; 11,14.5 10.5,14.5
  lines w0.1: -11,7 -10.5,7 ; -11,10.75 -10.5,10.75 ; -10.5,6.5 -10.5,7 ; -10.5,7.5 -10.5,7 ; -10.5,10.25 -10.5,10.75 ; -10.5,11.25 -10.5,10.75 ; -10,7 -10.5,7 ; -10,10.75 -10.5,10.75 ; -0.5,0 0,0 ; 0,-0.5 0,0 ; 0,0.5 0,0 ; 0.5,0 0,0
Mechanical 14:
  lines w0.1: -13.5,-17.25 ccw(c-12.5,-17.25) -12.5,-18.25 12.5,-18.25 ccw(c12.5,-17.25) 13.5,-17.25 13.5,17.25 ccw(c12.5,17.25) 12.5,18.25 -12.5,18.25 ccw(c-12.5,17.25) -13.5,17.25 -13.5,-17.25
  text "AC(N)" at 14.585,6.6 h1.2
  text "AC(L)" at 14.585,14.2 h1.2
  text "-Vo" at -17.8,10.4 h1.2
  text "+Vo" at -17.8,6.5 h1.2
3D body "PWS_TRACO_TMLM 04.stp": height 17.2, standoff -4, extent -13.5,-18.25 13.5,18.25